# Altium footprint library CONNECTOR HDR.PcbLib: 337 footprints (part 13 of 22)
Each footprint in its own frame and in the unit in brackets; x right, y up, seen from the top. Pads: shape width x height; smd on the part's side, far side on the other; paste and mask are expansions set on the pad; w line width, h text height; cw(c..) or ccw(c..) is an arc to the next point about the centre after c.
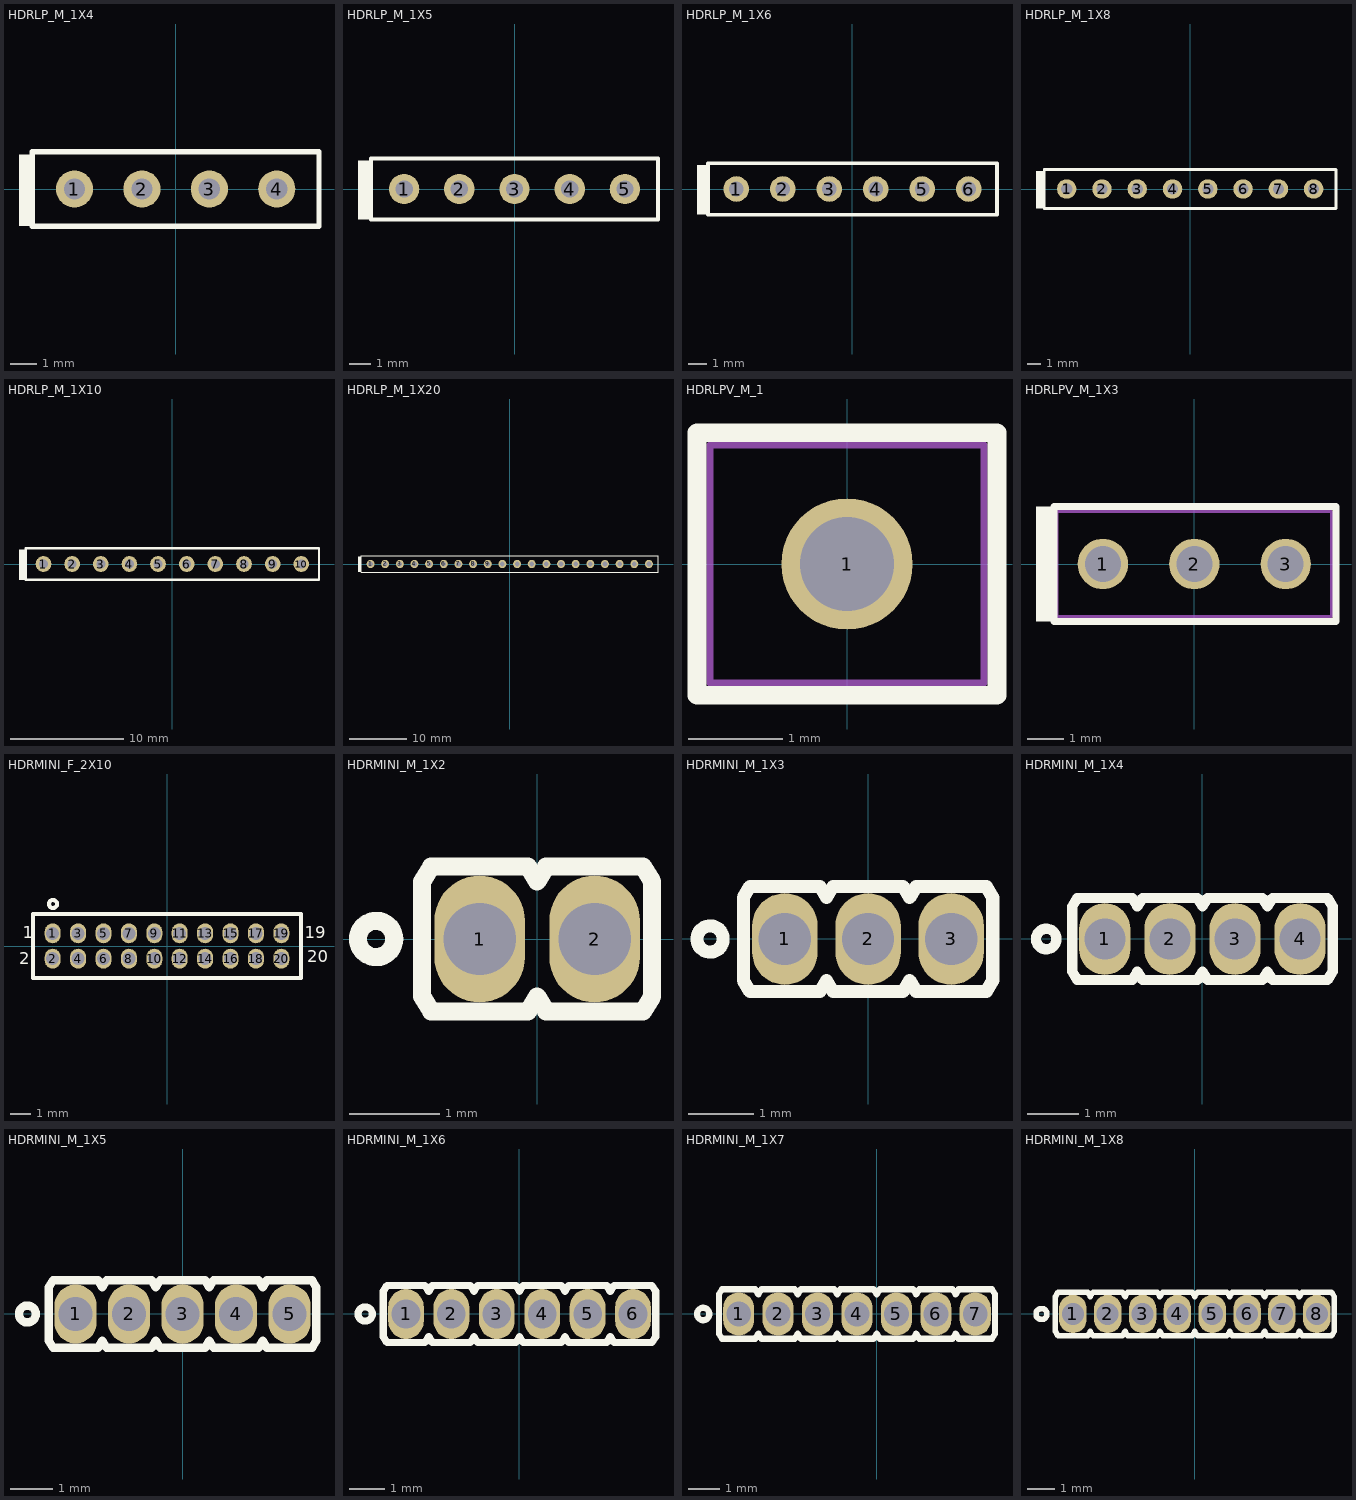
[diagram p12: the footprints below, top view; thin cyan lines are the x and y axes]

## HDRLP_M_1X4 [mm] "Connector Socket, Single-row 1-position, 0.100\" pitch"
height 4.191
pads (4):
  round 1.4 / inner round 1.4 / far side oval 1.4x2.2 hole 0.8 mask+0.1: 1(-3.81,0) 2(-1.27,0) 3(1.27,0) 4(3.81,0)
Top Overlay:
  rectangle: -5.9,-1.4 -5.4,1.3
  lines w0.2: -5.4,-1.4 5.4,-1.4 5.4,1.4 -5.4,1.4 -5.4,-1.4
3D body: height 6.78, standoff -3, extent -5.27,-1.27 -2.35,1.27
3D body: height 6.78, standoff -3, extent -2.73,-1.27 0.19,1.27
3D body: height 6.78, standoff -3, extent -0.19,-1.27 2.73,1.27
3D body: height 6.78, standoff -3, extent 2.35,-1.27 5.27,1.27

## HDRLP_M_1X5 [mm] "Connector Socket, Single-row 1-position, 0.100\" pitch"
height 4.191
pads (5):
  round 1.4 / inner round 1.4 / far side oval 1.4x2.2 hole 0.8 mask+0.1: 1(-5.08,0) 2(-2.54,0) 3(0,0) 4(2.54,0) 5(5.08,0)
Top Overlay:
  rectangle: -7.2,-1.4 -6.7,1.3
  lines w0.2: -6.6,-1.4 -6.6,1.4 6.6,1.4 6.6,-1.4 -6.6,-1.4
3D body: height 6.78, standoff -3, extent 3.62,-1.27 6.54,1.27
3D body: height 6.78, standoff -3, extent 1.08,-1.27 4,1.27
3D body: height 6.78, standoff -3, extent -1.46,-1.27 1.46,1.27
3D body: height 6.78, standoff -3, extent -4,-1.27 -1.08,1.27
3D body: height 6.78, standoff -3, extent -6.54,-1.27 -3.62,1.27

## HDRLP_M_1X6 [mm] "Connector Socket, Single-row 1-position, 0.100\" pitch"
height 4.191
pads (6):
  round 1.4 / inner round 1.4 / far side oval 1.4x2.2 hole 0.8 mask+0.1: 1(-6.35,0) 2(-3.81,0) 3(-1.27,0) 4(1.27,0) 5(3.81,0) 6(6.35,0)
Top Overlay:
  rectangle: -8.5,-1.4 -8,1.3
  lines w0.2: -7.9,-1.4 7.9,-1.4 7.9,1.4 -7.9,1.4 -7.9,-1.4
3D body: height 6.78, standoff -3, extent -7.81,-1.27 -4.89,1.27
3D body: height 6.78, standoff -3, extent -5.27,-1.27 -2.35,1.27
3D body: height 6.78, standoff -3, extent -2.73,-1.27 0.19,1.27
3D body: height 6.78, standoff -3, extent -0.19,-1.27 2.73,1.27
3D body: height 6.78, standoff -3, extent 2.35,-1.27 5.27,1.27
3D body: height 6.78, standoff -3, extent 4.89,-1.27 7.81,1.27

## HDRLP_M_1X8 [mm] "Connector Socket, Single-row 1-position, 0.100\" pitch"
height 4.191
pads (8):
  round 1.4 / inner round 1.4 / far side oval 1.4x2.2 hole 0.8 mask+0.1: 1(-8.89,0) 2(-6.35,0) 3(-3.81,0) 4(-1.27,0) 5(1.27,0) 6(3.81,0) 7(6.35,0) 8(8.89,0)
Top Overlay:
  rectangle: -11.1,-1.4 -10.6,1.3
  lines w0.2: -10.5,-1.4 -10.5,1.4 10.5,1.4 10.5,-1.4 -10.5,-1.4
3D body: height 6.78, standoff -3, extent -10.35,-1.27 -7.43,1.27
3D body: height 6.78, standoff -3, extent -7.81,-1.27 -4.89,1.27
3D body: height 6.78, standoff -3, extent -5.27,-1.27 -2.35,1.27
3D body: height 6.78, standoff -3, extent -2.73,-1.27 0.19,1.27
3D body: height 6.78, standoff -3, extent 7.43,-1.27 10.35,1.27
3D body: height 6.78, standoff -3, extent 4.89,-1.27 7.81,1.27
3D body: height 6.78, standoff -3, extent 2.35,-1.27 5.27,1.27
3D body: height 6.78, standoff -3, extent -0.19,-1.27 2.73,1.27

## HDRLP_M_1X10 [mm] "Connector Socket, Single-row 1-position, 0.100\" pitch"
height 4.191
pads (10):
  round 1.4 / inner round 1.4 / far side oval 1.4x2.2 hole 0.8 mask+0.1: 1(-11.43,0) 2(-8.89,0) 3(-6.35,0) 4(-3.81,0) 5(-1.27,0) 6(1.27,0) 7(3.81,0) 8(6.35,0) 9(8.89,0) 10(11.43,0)
Top Overlay:
  rectangle: -13.6,-1.4 -13.1,1.3
  lines w0.2: -13,-1.4 13,-1.4 13,1.4 -13,1.4 -13,-1.4
3D body: height 6.78, standoff -3, extent -5.27,-1.27 -2.35,1.27
3D body: height 6.78, standoff -3, extent -7.81,-1.27 -4.89,1.27
3D body: height 6.78, standoff -3, extent -10.35,-1.27 -7.43,1.27
3D body: height 6.78, standoff -3, extent -12.89,-1.27 -9.97,1.27
3D body: height 6.78, standoff -3, extent 4.89,-1.27 7.81,1.27
3D body: height 6.78, standoff -3, extent 2.35,-1.27 5.27,1.27
3D body: height 6.78, standoff -3, extent -0.19,-1.27 2.73,1.27
3D body: height 6.78, standoff -3, extent -2.73,-1.27 0.19,1.27
3D body: height 6.78, standoff -3, extent 9.97,-1.27 12.89,1.27
3D body: height 6.78, standoff -3, extent 7.43,-1.27 10.35,1.27

## HDRLP_M_1X20 [mm] "HEADER, FEMALE, MILITARY"
height 15
pads (20):
  round 1.4 / inner round 1.4 / far side oval 1.4x2.2 hole 0.8: 1(-24.13,0) 2(-21.59,0) 3(-19.05,0) 4(-16.51,0) 5(-13.97,0) 6(-11.43,0) 7(-8.89,0) 8(-6.35,0) 9(-3.81,0) 10(-1.27,0) 11(1.27,0) 12(3.81,0) 13(6.35,0) 14(8.89,0) 15(11.43,0) 16(13.97,0) 17(16.51,0) 18(19.05,0) 19(21.59,0) 20(24.13,0)
Top Overlay:
  rectangle: -26.3,-1.4 -25.8,1.3
  lines w0.2: -25.7,-1.4 25.7,-1.4 25.7,1.4 -25.7,1.4 -25.7,-1.4
3D body: height 6.78, standoff -3, extent -5.27,-1.27 -2.35,1.27
3D body: height 6.78, standoff -3, extent -2.73,-1.27 0.19,1.27
3D body: height 6.78, standoff -3, extent -15.43,-1.27 -12.51,1.27
3D body: height 6.78, standoff -3, extent -12.89,-1.27 -9.97,1.27
3D body: height 6.78, standoff -3, extent -10.35,-1.27 -7.43,1.27
3D body: height 6.78, standoff -3, extent -7.81,-1.27 -4.89,1.27
3D body: height 6.78, standoff -3, extent -25.59,-1.27 -22.67,1.27
3D body: height 6.78, standoff -3, extent -23.05,-1.27 -20.13,1.27
3D body: height 6.78, standoff -3, extent -20.51,-1.27 -17.59,1.27
3D body: height 6.78, standoff -3, extent -17.97,-1.27 -15.05,1.27
3D body: height 6.78, standoff -3, extent 20.13,-1.27 23.05,1.27
3D body: height 6.78, standoff -3, extent 22.67,-1.27 25.59,1.27
3D body: height 6.78, standoff -3, extent 9.97,-1.27 12.89,1.27
3D body: height 6.78, standoff -3, extent 12.51,-1.27 15.43,1.27
3D body: height 6.78, standoff -3, extent 15.05,-1.27 17.97,1.27
3D body: height 6.78, standoff -3, extent 17.59,-1.27 20.51,1.27
3D body: height 6.78, standoff -3, extent -0.19,-1.27 2.73,1.27
3D body: height 6.78, standoff -3, extent 2.35,-1.27 5.27,1.27
3D body: height 6.78, standoff -3, extent 4.89,-1.27 7.81,1.27
3D body: height 6.78, standoff -3, extent 7.43,-1.27 10.35,1.27

## HDRLPV_M_1 [mm] "HEADER, LowProfile, Single-row 1-position, 0.100\" pitch"
height 7.366
pads (1):
  round 1.4 / inner round 1.4 / far side oval 1.4x2.2 hole 1: 1(0,0)
Top Overlay:
  lines w0.2: -1.6,-1.4 -1.6,1.4 1.6,1.4 1.6,-1.4 -1.6,-1.4
Mechanical 13:
  lines w0.076: -1.46,-1.27 -1.46,1.27 1.46,1.27 1.46,-1.27 -1.46,-1.27
3D body: height 10.36, standoff 0.58, extent -1.46,-1.27 1.46,1.27
3D body: height 4.19, standoff -3.17, extent -1.46,-1.27 1.46,1.27

## HDRLPV_M_1X3 [mm] "HEADER, LowProfile, Single-row 3-position, 0.100\" pitch"
height 7.366
pads (3):
  round 1.4 / inner round 1.4 / far side oval 1.4x2.2 hole 1: 1(-2.54,0) 2(0,0) 3(2.54,0)
Top Overlay:
  rectangle: -4.4,-1.6 -3.9,1.6
  lines w0.2: -3.9,-1.6 3.937,-1.6 3.937,1.6 -3.9,1.6 -3.9,-1.6
Mechanical 13:
  lines w0.076: -3.81,-1.46 3.81,-1.46 3.81,1.46 -3.81,1.46 -3.81,-1.46
3D body: height 4.19, standoff -3.17, extent -3.81,-1.46 -1.27,1.46
3D body: height 4.19, standoff -3.17, extent -1.27,-1.46 1.27,1.46
3D body: height 4.19, standoff -3.17, extent 1.27,-1.46 3.81,1.46
3D body: height 10.36, standoff 0.58, extent -3.81,-1.46 -1.27,1.46
3D body: height 10.36, standoff 0.58, extent -1.27,-1.46 1.27,1.46
3D body: height 10.36, standoff 0.58, extent 1.27,-1.46 3.81,1.46

## HDRMINI_F_2X10 [mm] "FCI Minitek127® BTB, HEADER UNSHROUDED, 20   Part Number:  20021311-00020T4LF"
height 2
pads (20):
  oval 0.8x1 hole 0.65 mask+0.05: 1(-5.715,0.635) 2(-5.715,-0.635) 3(-4.445,0.635) 4(-4.445,-0.635) 5(-3.175,0.635) 6(-3.175,-0.635) 7(-1.905,0.635) 8(-1.905,-0.635) 9(-0.635,0.635) 10(-0.635,-0.635) 11(0.635,0.635) 12(0.635,-0.635) 13(1.905,0.635) 14(1.905,-0.635) 15(3.175,0.635) 16(3.175,-0.635) 17(4.445,0.635) 18(4.445,-0.635) 19(5.715,0.635) 20(5.715,-0.635)
Top Overlay:
  circle w0.2: c-5.7,2.1 r0.2
  lines w0.2: -6.7,-1.6 6.7,-1.6 6.7,1.6 -6.7,1.6 -6.7,-1.6
  text "20" at 7,-0.8 h0.6
  text "19" at 6.9,0.4 h0.6
  text "1" at -7.2,0.4 h0.6
  text "2" at -7.4,-0.9 h0.6
3D body: height 4.3, standoff -2.4, extent -6.58,-1.5 6.58,1.5

## HDRMINI_M_1X2 [mm] "mini header (50mil pitch)"
pads (2):
  oval 1x1.4 hole 0.8 mask+0.05: 1(-0.635,0) 2(0.635,0)
Top Overlay:
  circle w0.2: c-1.778,0 r0.2
  lines w0.2: -1.27,-0.635 -1.27,0.635 -1.171,0.8 -0.099,0.8 0,0.635 0.099,0.8 1.171,0.8 1.27,0.635 1.27,-0.635 1.171,-0.8 0.099,-0.8 0,-0.635 -0.099,-0.8 -1.171,-0.8 -1.27,-0.635
3D body: height 7.3, standoff -2.5, extent 0.435,-0.2 0.835,0.2
3D body: height 2.8, standoff 0, extent 0,-0.635 1.27,0.635
3D body: height 2.8, standoff 0, extent -1.27,-0.635 0,0.635
3D body: height 7.3, standoff -2.5, extent -0.835,-0.2 -0.435,0.2

## HDRMINI_M_1X3 [mm] "mini header (50mil pitch)"
pads (3):
  oval 1x1.4 hole 0.8 mask+0.05: 1(-1.27,0) 2(0,0) 3(1.27,0)
Top Overlay:
  circle w0.2: c-2.413,0 r0.2
  lines w0.2: -1.905,-0.635 -1.806,-0.8 -0.734,-0.8 -0.635,-0.635 -0.536,-0.8 0.536,-0.8 0.635,-0.635 0.734,-0.8 1.806,-0.8 1.905,-0.635 1.905,0.635 1.806,0.8 0.734,0.8 0.635,0.635 0.536,0.8 -0.536,0.8 -0.635,0.635 -0.734,0.8 -1.806,0.8 -1.905,0.635 -1.905,-0.635
3D body: height 7.3, standoff -2.5, extent 1.07,-0.2 1.47,0.2
3D body: height 2.8, standoff 0, extent 0.635,-0.635 1.905,0.635
3D body: height 7.3, standoff -2.5, extent -0.2,-0.2 0.2,0.2
3D body: height 2.8, standoff 0, extent -0.635,-0.635 0.635,0.635
3D body: height 7.3, standoff -2.5, extent -1.47,-0.2 -1.07,0.2
3D body: height 2.8, standoff 0, extent -1.905,-0.635 -0.635,0.635

## HDRMINI_M_1X4 [mm] "mini header (50mil pitch)"
pads (4):
  oval 1x1.4 hole 0.8 mask+0.05: 1(-1.905,0) 2(-0.635,0) 3(0.635,0) 4(1.905,0)
Top Overlay:
  circle w0.2: c-3.048,0 r0.2
  lines w0.2: -2.54,-0.635 -2.54,0.635 -2.441,0.8 -1.369,0.8 -1.27,0.635 -1.171,0.8 -0.099,0.8 0,0.635 0.099,0.8 1.171,0.8 1.27,0.635 1.369,0.8 2.441,0.8 2.54,0.635 2.54,-0.635 2.441,-0.8 1.369,-0.8 1.27,-0.635 1.171,-0.8 0.099,-0.8 0,-0.635 -0.099,-0.8 -1.171,-0.8 -1.27,-0.635 -1.369,-0.8 -2.441,-0.8 -2.54,-0.635
3D body: height 2.8, standoff 0, extent -2.54,-0.635 -1.27,0.635
3D body: height 7.3, standoff -2.5, extent -2.105,-0.2 -1.705,0.2
3D body: height 2.8, standoff 0, extent 1.27,-0.635 2.54,0.635
3D body: height 7.3, standoff -2.5, extent 1.705,-0.2 2.105,0.2
3D body: height 2.8, standoff 0, extent 0,-0.635 1.27,0.635
3D body: height 7.3, standoff -2.5, extent 0.435,-0.2 0.835,0.2
3D body: height 2.8, standoff 0, extent -1.27,-0.635 0,0.635
3D body: height 7.3, standoff -2.5, extent -0.835,-0.2 -0.435,0.2

## HDRMINI_M_1X5 [mm] "mini header (50mil pitch)"
pads (5):
  oval 1x1.4 hole 0.8 mask+0.05: 1(-2.54,0) 2(-1.27,0) 3(0,0) 4(1.27,0) 5(2.54,0)
Top Overlay:
  circle w0.2: c-3.683,0 r0.2
  lines w0.2: -3.175,-0.635 -3.175,0.635 -3.076,0.8 -2.004,0.8 -1.905,0.635 -1.806,0.8 -0.734,0.8 -0.635,0.635 -0.536,0.8 0.536,0.8 0.635,0.635 0.734,0.8 1.806,0.8 1.905,0.635 2.004,0.8 3.076,0.8 3.175,0.635 3.175,-0.635 3.076,-0.8 2.004,-0.8 1.905,-0.635 1.806,-0.8 0.734,-0.8 0.635,-0.635 0.536,-0.8 -0.536,-0.8 -0.635,-0.635 -0.734,-0.8 -1.806,-0.8 -1.905,-0.635 -2.004,-0.8 -3.076,-0.8 -3.175,-0.635
3D body: height 2.8, standoff 0, extent -3.175,-0.635 -1.905,0.635
3D body: height 7.3, standoff -2.5, extent -2.74,-0.2 -2.34,0.2
3D body: height 2.8, standoff 0, extent 1.905,-0.635 3.175,0.635
3D body: height 7.3, standoff -2.5, extent 2.34,-0.2 2.74,0.2
3D body: height 2.8, standoff 0, extent 0.635,-0.635 1.905,0.635
3D body: height 7.3, standoff -2.5, extent 1.07,-0.2 1.47,0.2
3D body: height 2.8, standoff 0, extent -0.635,-0.635 0.635,0.635
3D body: height 7.3, standoff -2.5, extent -0.2,-0.2 0.2,0.2
3D body: height 2.8, standoff 0, extent -1.905,-0.635 -0.635,0.635
3D body: height 7.3, standoff -2.5, extent -1.47,-0.2 -1.07,0.2

## HDRMINI_M_1X6 [mm] "mini header (50mil pitch)"
pads (6):
  oval 1x1.4 hole 0.8 mask+0.05: 1(-3.175,0) 2(-1.905,0) 3(-0.635,0) 4(0.635,0) 5(1.905,0) 6(3.175,0)
Top Overlay:
  circle w0.2: c-4.318,0 r0.2
  lines w0.2: -3.81,-0.635 -3.711,-0.8 -2.639,-0.8 -2.54,-0.635 -2.441,-0.8 -1.369,-0.8 -1.27,-0.635 -1.171,-0.8 -0.099,-0.8 0,-0.635 0.099,-0.8 1.171,-0.8 1.27,-0.635 1.369,-0.8 2.441,-0.8 2.54,-0.635 2.639,-0.8 3.711,-0.8 3.81,-0.635 3.81,0.635 3.711,0.8 2.639,0.8 2.54,0.635 2.441,0.8 1.369,0.8 1.27,0.635 1.171,0.8 0.099,0.8 0,0.635 -0.099,0.8 -1.171,0.8 -1.27,0.635 -1.369,0.8 -2.441,0.8 -2.54,0.635 -2.639,0.8 -3.711,0.8 -3.81,0.635 -3.81,-0.635
3D body: height 2.8, standoff 0, extent -2.54,-0.635 -1.27,0.635
3D body: height 7.3, standoff -2.5, extent -2.105,-0.2 -1.705,0.2
3D body: height 2.8, standoff 0, extent -1.27,-0.635 0,0.635
3D body: height 7.3, standoff -2.5, extent -0.835,-0.2 -0.435,0.2
3D body: height 2.8, standoff 0, extent 0,-0.635 1.27,0.635
3D body: height 7.3, standoff -2.5, extent 0.435,-0.2 0.835,0.2
3D body: height 2.8, standoff 0, extent 1.27,-0.635 2.54,0.635
3D body: height 7.3, standoff -2.5, extent 1.705,-0.2 2.105,0.2
3D body: height 2.8, standoff 0, extent 2.54,-0.635 3.81,0.635
3D body: height 7.3, standoff -2.5, extent 2.975,-0.2 3.375,0.2
3D body: height 7.3, standoff -2.5, extent -3.375,-0.2 -2.975,0.2
3D body: height 2.8, standoff 0, extent -3.81,-0.635 -2.54,0.635

## HDRMINI_M_1X7 [mm] "mini header (50mil pitch)"
pads (7):
  oval 1x1.4 hole 0.8 mask+0.05: 1(-4.445,0) 2(-3.175,0) 3(-1.905,0) 4(-0.635,0) 5(0.635,0) 6(1.905,0) 7(3.175,0)
Top Overlay:
  circle w0.2: c-5.588,0 r0.2
  lines w0.2: -5.08,-0.635 -4.981,-0.8 -3.909,-0.8 -3.81,-0.635 -3.711,-0.8 -2.639,-0.8 -2.54,-0.635 -2.441,-0.8 -1.369,-0.8 -1.27,-0.635 -1.171,-0.8 -0.099,-0.8 0,-0.635 0.099,-0.8 1.171,-0.8 1.27,-0.635 1.369,-0.8 2.441,-0.8 2.54,-0.635 2.639,-0.8 3.711,-0.8 3.81,-0.635 3.81,0.635 3.711,0.8 2.639,0.8 2.54,0.635 2.441,0.8 1.369,0.8 1.27,0.635 1.171,0.8 0.099,0.8 0,0.635 -0.099,0.8 -1.171,0.8 -1.27,0.635 -1.369,0.8 -2.441,0.8 -2.54,0.635 -2.639,0.8 -3.711,0.8 -3.81,0.635 -3.909,0.8 -4.981,0.8 -5.08,0.635 -5.08,-0.635
3D body: height 2.8, standoff 0, extent -3.81,-0.635 -2.54,0.635
3D body: height 7.3, standoff -2.5, extent -3.375,-0.2 -2.975,0.2
3D body: height 2.8, standoff 0, extent -2.54,-0.635 -1.27,0.635
3D body: height 7.3, standoff -2.5, extent -2.105,-0.2 -1.705,0.2
3D body: height 2.8, standoff 0, extent -1.27,-0.635 0,0.635
3D body: height 7.3, standoff -2.5, extent -0.835,-0.2 -0.435,0.2
3D body: height 2.8, standoff 0, extent 0,-0.635 1.27,0.635
3D body: height 7.3, standoff -2.5, extent 0.435,-0.2 0.835,0.2
3D body: height 2.8, standoff 0, extent 1.27,-0.635 2.54,0.635
3D body: height 7.3, standoff -2.5, extent 1.705,-0.2 2.105,0.2
3D body: height 7.3, standoff -2.5, extent 2.975,-0.2 3.375,0.2
3D body: height 2.8, standoff 0, extent 2.54,-0.635 3.81,0.635
3D body: height 7.3, standoff -2.5, extent -4.645,-0.2 -4.245,0.2
3D body: height 2.8, standoff 0, extent -5.08,-0.635 -3.81,0.635

## HDRMINI_M_1X8 [mm] "mini header (50mil pitch)"
pads (8):
  oval 1x1.4 hole 0.8 mask+0.05: 1(-4.445,0) 2(-3.175,0) 3(-1.905,0) 4(-0.635,0) 5(0.635,0) 6(1.905,0) 7(3.175,0) 8(4.445,0)
Top Overlay:
  circle w0.2: c-5.588,0 r0.2
  lines w0.2: -5.08,-0.635 -4.981,-0.8 -3.909,-0.8 -3.81,-0.635 -3.711,-0.8 -2.639,-0.8 -2.54,-0.635 -2.441,-0.8 -1.369,-0.8 -1.27,-0.635 -1.171,-0.8 -0.099,-0.8 0,-0.635 0.099,-0.8 1.171,-0.8 1.27,-0.635 1.369,-0.8 2.441,-0.8 2.54,-0.635 2.639,-0.8 3.711,-0.8 3.81,-0.635 3.909,-0.8 4.981,-0.8 5.08,-0.635 5.08,0.635 4.981,0.8 3.909,0.8 3.81,0.635 3.711,0.8 2.639,0.8 2.54,0.635 2.441,0.8 1.369,0.8 1.27,0.635 1.171,0.8 0.099,0.8 0,0.635 -0.099,0.8 -1.171,0.8 -1.27,0.635 -1.369,0.8 -2.441,0.8 -2.54,0.635 -2.639,0.8 -3.711,0.8 -3.81,0.635 -3.909,0.8 -4.981,0.8 -5.08,0.635 -5.08,-0.635
3D body: height 2.8, standoff 0, extent -3.81,-0.635 -2.54,0.635
3D body: height 7.3, standoff -2.5, extent -3.375,-0.2 -2.975,0.2
3D body: height 2.8, standoff 0, extent -2.54,-0.635 -1.27,0.635
3D body: height 7.3, standoff -2.5, extent -2.105,-0.2 -1.705,0.2
3D body: height 2.8, standoff 0, extent -1.27,-0.635 0,0.635
3D body: height 7.3, standoff -2.5, extent -0.835,-0.2 -0.435,0.2
3D body: height 2.8, standoff 0, extent 0,-0.635 1.27,0.635
3D body: height 7.3, standoff -2.5, extent 0.435,-0.2 0.835,0.2
3D body: height 2.8, standoff 0, extent 1.27,-0.635 2.54,0.635
3D body: height 7.3, standoff -2.5, extent 1.705,-0.2 2.105,0.2
3D body: height 7.3, standoff -2.5, extent 2.975,-0.2 3.375,0.2
3D body: height 2.8, standoff 0, extent 2.54,-0.635 3.81,0.635
3D body: height 7.3, standoff -2.5, extent 4.245,-0.2 4.645,0.2
3D body: height 2.8, standoff 0, extent 3.81,-0.635 5.08,0.635
3D body: height 7.3, standoff -2.5, extent -4.645,-0.2 -4.245,0.2
3D body: height 2.8, standoff 0, extent -5.08,-0.635 -3.81,0.635